# Altium integrated library WE_WR-TBL_Pluggable System_3.81 mm_rev15b.IntLib: 215 symbols (part 2 of 2)
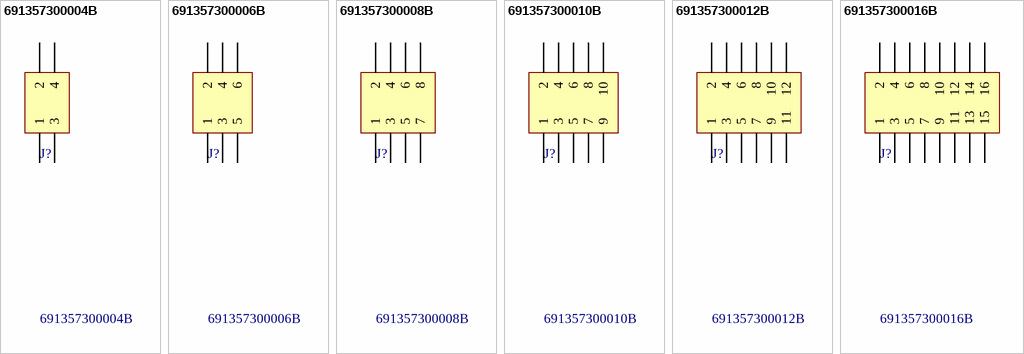
[diagram p20: symbols 691357300004B to 691357300016B]

## 691357300010B
designator J?
WR-TBL Terminal block - serie 357 B - 3.81 mm; Manufacturer: Würth Elektronik eiSos GmbH; ComponentLink1 Description: Manufacturer; ComponentLink2 Description: Datasheet; NoPins: 10; Created Date: 6 January 2014; partNo: 691357300010B; ComponentLink1URL: http://www.we-online.com; ComponentLink2URL: http://katalog.we-online.de/em/datasheet/6913573000xxB.pdf; Created by: Karrer Zheng
footprint 691357300010B (3,81mm - PCB - Double level - Vertical - with flanges - 10p)
pins: 1, 2, 3, 4, 5, 6, 7, 8, 9, 10

## 691357300012B
designator J?
WR-TBL Terminal block - serie 357 B - 3.81 mm; Manufacturer: Würth Elektronik eiSos GmbH; ComponentLink1 Description: Manufacturer; ComponentLink2 Description: Datasheet; NoPins: 12; Created Date: 6 January 2014; partNo: 691357300012B; ComponentLink1URL: http://www.we-online.com; ComponentLink2URL: http://katalog.we-online.de/em/datasheet/6913573000xxB.pdf; Created by: Karrer Zheng
footprint 691357300012B (3,81mm - PCB - Double level - Vertical - with flanges - 12p)
pins: 1, 2, 3, 4, 5, 6, 7, 8, 9, 10, 11, 12

## 691357300016B
designator J?
WR-TBL Terminal block - serie 357 B - 3.81 mm; Manufacturer: Würth Elektronik eiSos GmbH; ComponentLink1 Description: Manufacturer; ComponentLink2 Description: Datasheet; NoPins: 16; Created Date: 6 January 2014; partNo: 691357300016B; ComponentLink1URL: http://www.we-online.com; ComponentLink2URL: http://katalog.we-online.de/em/datasheet/6913573000xxB.pdf; Created by: Karrer Zheng
footprint 691357300016B (3,81mm - PCB - Double level - Vertical - with flanges - 16p)
pins: 1, 2, 3, 4, 5, 6, 7, 8, 9, 10, 11, 12, 13, 14, 15, 16


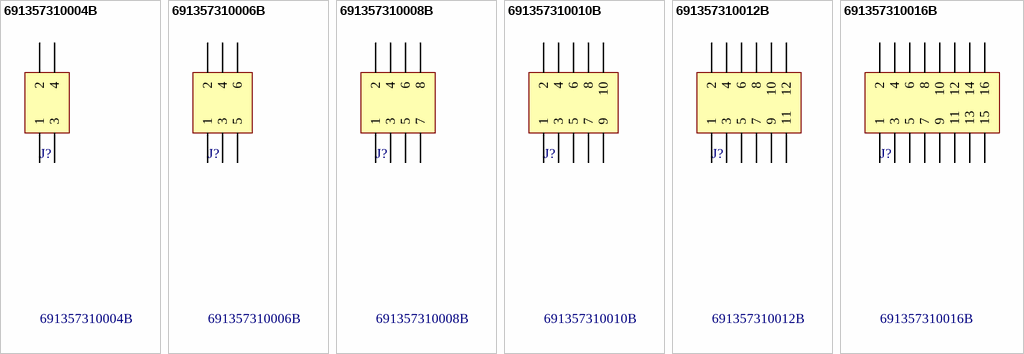
[diagram p15: symbols 691357310004B to 691357310016B]

## 691357310004B
designator J?
WR-TBL Terminal block - serie 357 B - 3.81 mm; Manufacturer: Würth Elektronik eiSos GmbH; ComponentLink1 Description: Manufacturer; ComponentLink2 Description: Datasheet; NoPins: 04; Created Date: 6 January 2014; partNo: 691357310004B; ComponentLink1URL: http://www.we-online.com; ComponentLink2URL: http://katalog.we-online.de/em/datasheet/6913573100xxB.pdf; Created by: Karrer Zheng
footprint 691357310004B (3,81mm - PCB - Double level - Horizontal - with flanges - 04p)
pins: 1, 2, 3, 4

## 691357310006B
designator J?
WR-TBL Terminal block - serie 357 B - 3.81 mm; Manufacturer: Würth Elektronik eiSos GmbH; ComponentLink1 Description: Manufacturer; ComponentLink2 Description: Datasheet; NoPins: 06; Created Date: 6 January 2014; partNo: 691357310006B; ComponentLink1URL: http://www.we-online.com; ComponentLink2URL: http://katalog.we-online.de/em/datasheet/6913573100xxB.pdf; Created by: Karrer Zheng
footprint 691357310006B (3,81mm - PCB - Double level - Horizontal - with flanges - 06p)
pins: 1, 2, 3, 4, 5, 6

## 691357310008B
designator J?
WR-TBL Terminal block - serie 357 B - 3.81 mm; Manufacturer: Würth Elektronik eiSos GmbH; ComponentLink1 Description: Manufacturer; ComponentLink2 Description: Datasheet; NoPins: 08; Created Date: 6 January 2014; partNo: 691357310008B; ComponentLink1URL: http://www.we-online.com; ComponentLink2URL: http://katalog.we-online.de/em/datasheet/6913573100xxB.pdf; Created by: Karrer Zheng
footprint 691357310008B (3,81mm - PCB - Double level - Horizontal - with flanges - 08p)
pins: 1, 2, 3, 4, 5, 6, 7, 8

## 691357310010B
designator J?
WR-TBL Terminal block - serie 357 B - 3.81 mm; Manufacturer: Würth Elektronik eiSos GmbH; ComponentLink1 Description: Manufacturer; ComponentLink2 Description: Datasheet; NoPins: 10; Created Date: 6 January 2014; partNo: 691357310010B; ComponentLink1URL: http://www.we-online.com; ComponentLink2URL: http://katalog.we-online.de/em/datasheet/6913573100xxB.pdf; Created by: Karrer Zheng
footprint 691357310010B (3,81mm - PCB - Double level - Horizontal - with flanges - 10p)
pins: 1, 2, 3, 4, 5, 6, 7, 8, 9, 10

## 691357310012B
designator J?
WR-TBL Terminal block - serie 357 B - 3.81 mm; Manufacturer: Würth Elektronik eiSos GmbH; ComponentLink1 Description: Manufacturer; ComponentLink2 Description: Datasheet; NoPins: 12; Created Date: 6 January 2014; partNo: 691357310012B; ComponentLink1URL: http://www.we-online.com; ComponentLink2URL: http://katalog.we-online.de/em/datasheet/6913573100xxB.pdf; Created by: Karrer Zheng
footprint 691357310012B (3,81mm - PCB - Double level - Horizontal - with flanges - 12p)
pins: 1, 2, 3, 4, 5, 6, 7, 8, 9, 10, 11, 12

## 691357310016B
designator J?
WR-TBL Terminal block - serie 357 B - 3.81 mm; Manufacturer: Würth Elektronik eiSos GmbH; ComponentLink1 Description: Manufacturer; ComponentLink2 Description: Datasheet; NoPins: 16; Created Date: 6 January 2014; partNo: 691357310016B; ComponentLink1URL: http://www.we-online.com; ComponentLink2URL: http://katalog.we-online.de/em/datasheet/6913573100xxB.pdf; Created by: Karrer Zheng
footprint 691357310016B (3,81mm - PCB - Double level - Horizontal - with flanges - 16p)
pins: 1, 2, 3, 4, 5, 6, 7, 8, 9, 10, 11, 12, 13, 14, 15, 16


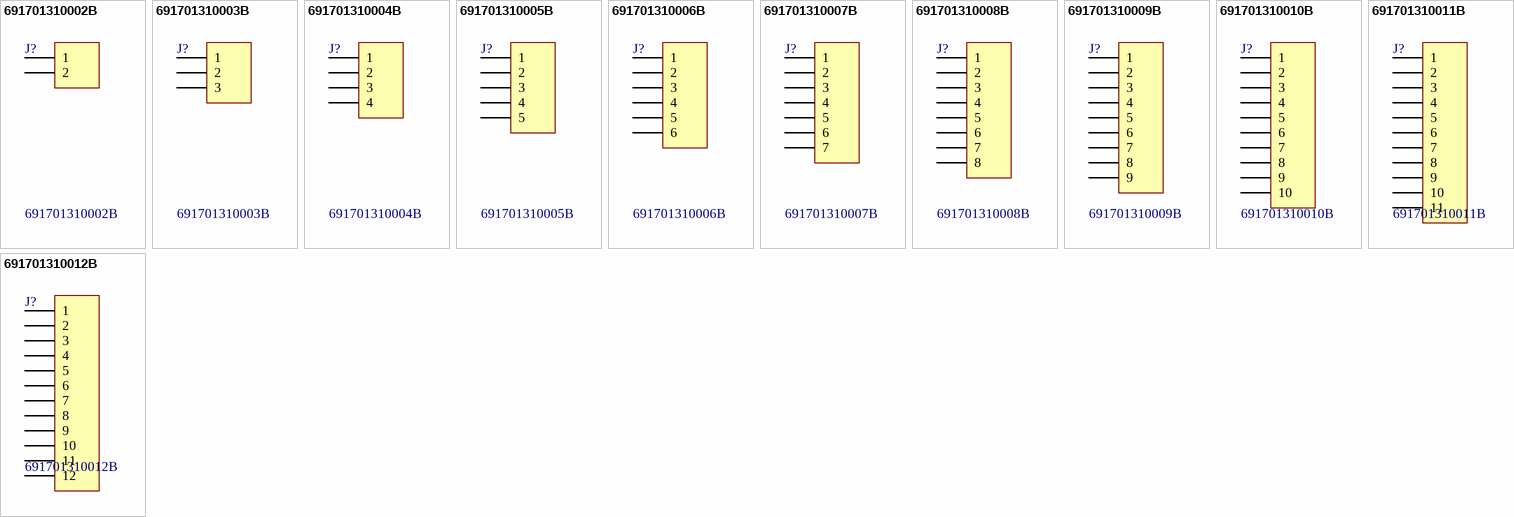
[diagram p16: symbols 691701310002B to 691701310012B]

## 691701310002B
designator J?
WR-TBL Terminal block - serie 7013 B- 3.81 mm; Manufacturer: Würth Elektronik eiSos GmbH; ComponentLink1 Description: Manufacturer; ComponentLink2 Description: Datasheet; NoPins: 2; Created Date: 12 December 2013; partNo: 691701310002B; ComponentLink1URL: http://www.we-online.com; ComponentLink2URL: http://katalog.we-online.de/em/datasheet/6917013100xxB.pdf; Created by: Karrer Zheng
footprint 691701310002B (THR - 3,81mm - PCB Vertical Close - 02p)
pins: 1, 2

## 691701310003B
designator J?
WR-TBL Terminal block - serie 7013 B- 3.81 mm; Manufacturer: Würth Elektronik eiSos GmbH; ComponentLink1 Description: Manufacturer; ComponentLink2 Description: Datasheet; NoPins: 3; Created Date: 12 December 2013; partNo: 691701310003B; ComponentLink1URL: http://www.we-online.com; ComponentLink2URL: http://katalog.we-online.de/em/datasheet/6917013100xxB.pdf; Created by: Karrer Zheng
footprint 691701310003B (THR - 3,81mm - PCB Vertical Close - 03p)
pins: 1, 2, 3

## 691701310004B
designator J?
WR-TBL Terminal block - serie 7013 B- 3.81 mm; Manufacturer: Würth Elektronik eiSos GmbH; ComponentLink1 Description: Manufacturer; ComponentLink2 Description: Datasheet; NoPins: 4; Created Date: 12 December 2013; partNo: 691701310004B; ComponentLink1URL: http://www.we-online.com; ComponentLink2URL: http://katalog.we-online.de/em/datasheet/6917013100xxB.pdf; Created by: Karrer Zheng
footprint 691701310004B (THR - 3,81mm - PCB Vertical Close - 04p)
pins: 1, 2, 3, 4

## 691701310005B
designator J?
WR-TBL Terminal block - serie 7013 B- 3.81 mm; Manufacturer: Würth Elektronik eiSos GmbH; ComponentLink1 Description: Manufacturer; ComponentLink2 Description: Datasheet; NoPins: 5; Created Date: 12 December 2013; partNo: 691701310005B; ComponentLink1URL: http://www.we-online.com; ComponentLink2URL: http://katalog.we-online.de/em/datasheet/6917013100xxB.pdf; Created by: Karrer Zheng
footprint 691701310005B (THR - 3,81mm - PCB Vertical Close - 05p)
pins: 1, 2, 3, 4, 5

## 691701310006B
designator J?
WR-TBL Terminal block - serie 7013 B- 3.81 mm; Manufacturer: Würth Elektronik eiSos GmbH; ComponentLink1 Description: Manufacturer; ComponentLink2 Description: Datasheet; NoPins: 6; Created Date: 12 December 2013; partNo: 691701310006B; ComponentLink1URL: http://www.we-online.com; ComponentLink2URL: http://katalog.we-online.de/em/datasheet/6917013100xxB.pdf; Created by: Karrer Zheng
footprint 691701310006B (THR - 3,81mm - PCB Vertical Close - 06p)
pins: 1, 2, 3, 4, 5, 6

## 691701310007B
designator J?
WR-TBL Terminal block - serie 7013 B- 3.81 mm; Manufacturer: Würth Elektronik eiSos GmbH; ComponentLink1 Description: Manufacturer; ComponentLink2 Description: Datasheet; NoPins: 7; Created Date: 12 December 2013; partNo: 691701310007B; ComponentLink1URL: http://www.we-online.com; ComponentLink2URL: http://katalog.we-online.de/em/datasheet/6917013100xxB.pdf; Created by: Karrer Zheng
footprint 691701310007B (THR - 3,81mm - PCB Vertical Close - 07p)
pins: 1, 2, 3, 4, 5, 6, 7

## 691701310008B
designator J?
WR-TBL Terminal block - serie 7013 B- 3.81 mm; Manufacturer: Würth Elektronik eiSos GmbH; ComponentLink1 Description: Manufacturer; ComponentLink2 Description: Datasheet; NoPins: 8; Created Date: 12 December 2013; partNo: 691701310008B; ComponentLink1URL: http://www.we-online.com; ComponentLink2URL: http://katalog.we-online.de/em/datasheet/6917013100xxB.pdf; Created by: Karrer Zheng
footprint 691701310008B (THR - 3,81mm - PCB Vertical Close - 08p)
pins: 1, 2, 3, 4, 5, 6, 7, 8

## 691701310009B
designator J?
WR-TBL Terminal block - serie 7013 B- 3.81 mm; Manufacturer: Würth Elektronik eiSos GmbH; ComponentLink1 Description: Manufacturer; ComponentLink2 Description: Datasheet; NoPins: 9; Created Date: 12 December 2013; partNo: 691701310009B; ComponentLink1URL: http://www.we-online.com; ComponentLink2URL: http://katalog.we-online.de/em/datasheet/6917013100xxB.pdf; Created by: Karrer Zheng
footprint 691701310009B (THR - 3,81mm - PCB Vertical Close - 09p)
pins: 1, 2, 3, 4, 5, 6, 7, 8, 9

## 691701310010B
designator J?
WR-TBL Terminal block - serie 7013 B- 3.81 mm; Manufacturer: Würth Elektronik eiSos GmbH; ComponentLink1 Description: Manufacturer; ComponentLink2 Description: Datasheet; NoPins: 10; Created Date: 12 December 2013; partNo: 691701310010B; ComponentLink1URL: http://www.we-online.com; ComponentLink2URL: http://katalog.we-online.de/em/datasheet/6917013100xxB.pdf; Created by: Karrer Zheng
footprint 691701310010B (THR - 3,81mm - PCB Vertical Close - 10p)
pins: 1, 2, 3, 4, 5, 6, 7, 8, 9, 10

## 691701310011B
designator J?
WR-TBL Terminal block - serie 7013 B- 3.81 mm; Manufacturer: Würth Elektronik eiSos GmbH; ComponentLink1 Description: Manufacturer; ComponentLink2 Description: Datasheet; NoPins: 11; Created Date: 12 December 2013; partNo: 691701310011B; ComponentLink1URL: http://www.we-online.com; ComponentLink2URL: http://katalog.we-online.de/em/datasheet/6917013100xxB.pdf; Created by: Karrer Zheng
footprint 691701310011B (THR - 3,81mm - PCB Vertical Close - 11p)
pins: 1, 2, 3, 4, 5, 6, 7, 8, 9, 10, 11

## 691701310012B
designator J?
WR-TBL Terminal block - serie 7013 B- 3.81 mm; Manufacturer: Würth Elektronik eiSos GmbH; ComponentLink1 Description: Manufacturer; ComponentLink2 Description: Datasheet; NoPins: 12; Created Date: 12 December 2013; partNo: 691701310012B; ComponentLink1URL: http://www.we-online.com; ComponentLink2URL: http://katalog.we-online.de/em/datasheet/6917013100xxB.pdf; Created by: Karrer Zheng
footprint 691701310012B (THR - 3,81mm - PCB Vertical Close - 12p)
pins: 1, 2, 3, 4, 5, 6, 7, 8, 9, 10, 11, 12


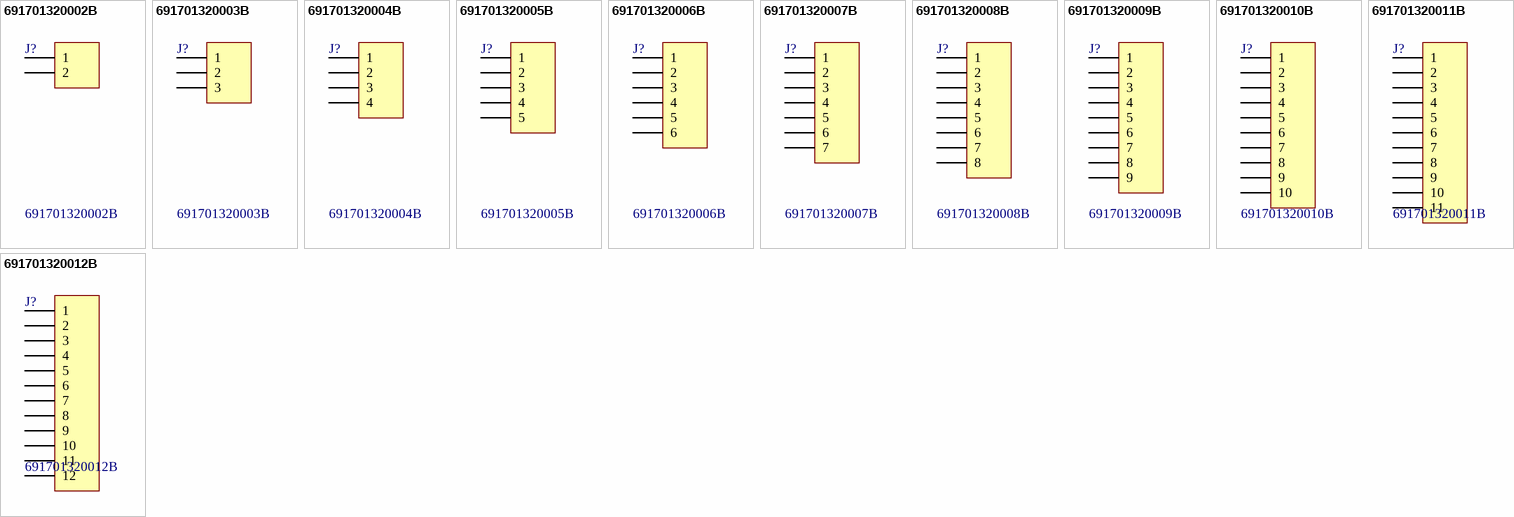
[diagram p17: symbols 691701320002B to 691701320012B]

## 691701320002B
designator J?
WR-TBL Terminal block - serie 7013 VF- 3.81 mm; Manufacturer: Würth Elektronik eiSos GmbH; ComponentLink1 Description: Manufacturer; ComponentLink2 Description: Datasheet; NoPins: 2; Created Date: 18 December 2013; partNo: 691701320002B; ComponentLink1URL: http://www.we-online.com; ComponentLink2URL: http://katalog.we-online.de/em/datasheet/6917013200xxB.pdf; Created by: Karrer Zheng
footprint 691701320002B
pins: 1, 2

## 691701320003B
designator J?
WR-TBL Terminal block - serie 7013 VF- 3.81 mm; Manufacturer: Würth Elektronik eiSos GmbH; ComponentLink1 Description: Manufacturer; ComponentLink2 Description: Datasheet; NoPins: 3; Created Date: 18 December 2013; partNo: 691701320003B; ComponentLink1URL: http://www.we-online.com; ComponentLink2URL: http://katalog.we-online.de/em/datasheet/6917013200xxB.pdf; Created by: Karrer Zheng
footprint 691701320003B (THR - 3,81mm - PCB Vertical Flange - 03p)
pins: 1, 2, 3

## 691701320004B
designator J?
WR-TBL Terminal block - serie 7013 VF- 3.81 mm; Manufacturer: Würth Elektronik eiSos GmbH; ComponentLink1 Description: Manufacturer; ComponentLink2 Description: Datasheet; NoPins: 4; Created Date: 18 December 2013; partNo: 691701320004B; ComponentLink1URL: http://www.we-online.com; ComponentLink2URL: http://katalog.we-online.de/em/datasheet/6917013200xxB.pdf; Created by: Karrer Zheng
footprint 691701320004B (THR - 3,81mm - PCB Vertical Flange - 04p)
pins: 1, 2, 3, 4

## 691701320005B
designator J?
WR-TBL Terminal block - serie 7013 VF- 3.81 mm; Manufacturer: Würth Elektronik eiSos GmbH; ComponentLink1 Description: Manufacturer; ComponentLink2 Description: Datasheet; NoPins: 5; Created Date: 18 December 2013; partNo: 691701320005B; ComponentLink1URL: http://www.we-online.com; ComponentLink2URL: http://katalog.we-online.de/em/datasheet/6917013200xxB.pdf; Created by: Karrer Zheng
footprint 691701320005B (THR - 3,81mm - PCB Vertical Flange - 05p)
pins: 1, 2, 3, 4, 5

## 691701320006B
designator J?
WR-TBL Terminal block - serie 7013 VF- 3.81 mm; Manufacturer: Würth Elektronik eiSos GmbH; ComponentLink1 Description: Manufacturer; ComponentLink2 Description: Datasheet; NoPins: 6; Created Date: 18 December 2013; partNo: 691701320006B; ComponentLink1URL: http://www.we-online.com; ComponentLink2URL: http://katalog.we-online.de/em/datasheet/6917013200xxB.pdf; Created by: Karrer Zheng
footprint 691701320006B (THR - 3,81mm - PCB Vertical Flange - 06p)
pins: 1, 2, 3, 4, 5, 6

## 691701320007B
designator J?
WR-TBL Terminal block - serie 7013 VF- 3.81 mm; Manufacturer: Würth Elektronik eiSos GmbH; ComponentLink1 Description: Manufacturer; ComponentLink2 Description: Datasheet; NoPins: 7; Created Date: 18 December 2013; partNo: 691701320007B; ComponentLink1URL: http://www.we-online.com; ComponentLink2URL: http://katalog.we-online.de/em/datasheet/6917013200xxB.pdf; Created by: Karrer Zheng
footprint 691701320007B (THR - 3,81mm - PCB Vertical Flange - 07p)
pins: 1, 2, 3, 4, 5, 6, 7

## 691701320008B
designator J?
WR-TBL Terminal block - serie 7013 VF- 3.81 mm; Manufacturer: Würth Elektronik eiSos GmbH; ComponentLink1 Description: Manufacturer; ComponentLink2 Description: Datasheet; NoPins: 8; Created Date: 18 December 2013; partNo: 691701320008B; ComponentLink1URL: http://www.we-online.com; ComponentLink2URL: http://katalog.we-online.de/em/datasheet/6917013200xxB.pdf; Created by: Karrer Zheng
footprint 691701320008B (THR - 3,81mm - PCB Vertical Flange - 08p)
pins: 1, 2, 3, 4, 5, 6, 7, 8

## 691701320009B
designator J?
WR-TBL Terminal block - serie 7013 VF- 3.81 mm; Manufacturer: Würth Elektronik eiSos GmbH; ComponentLink1 Description: Manufacturer; ComponentLink2 Description: Datasheet; NoPins: 9; Created Date: 18 December 2013; partNo: 691701320009B; ComponentLink1URL: http://www.we-online.com; ComponentLink2URL: http://katalog.we-online.de/em/datasheet/6917013200xxB.pdf; Created by: Karrer Zheng
footprint 691701320009B (THR - 3,81mm - PCB Vertical Flange - 09p)
pins: 1, 2, 3, 4, 5, 6, 7, 8, 9

## 691701320010B
designator J?
WR-TBL Terminal block - serie 7013 VF- 3.81 mm; Manufacturer: Würth Elektronik eiSos GmbH; ComponentLink1 Description: Manufacturer; ComponentLink2 Description: Datasheet; NoPins: 10; Created Date: 18 December 2013; partNo: 691701320010B; ComponentLink1URL: http://www.we-online.com; ComponentLink2URL: http://katalog.we-online.de/em/datasheet/6917013200xxB.pdf; Created by: Karrer Zheng
footprint 691701320010B (THR - 3,81mm - PCB Vertical Flange - 10p)
pins: 1, 2, 3, 4, 5, 6, 7, 8, 9, 10

## 691701320011B
designator J?
WR-TBL Terminal block - serie 7013 VF- 3.81 mm; Manufacturer: Würth Elektronik eiSos GmbH; ComponentLink1 Description: Manufacturer; ComponentLink2 Description: Datasheet; NoPins: 11; Created Date: 18 December 2013; partNo: 691701320011B; ComponentLink1URL: http://www.we-online.com; ComponentLink2URL: http://katalog.we-online.de/em/datasheet/6917013200xxB.pdf; Created by: Karrer Zheng
footprint 691701320011B (THR - 3,81mm - PCB Vertical Flange - 11p)
pins: 1, 2, 3, 4, 5, 6, 7, 8, 9, 10, 11

## 691701320012B
designator J?
WR-TBL Terminal block - serie 7013 VF- 3.81 mm; Manufacturer: Würth Elektronik eiSos GmbH; ComponentLink1 Description: Manufacturer; ComponentLink2 Description: Datasheet; NoPins: 12; Created Date: 18 December 2013; partNo: 691701320012B; ComponentLink1URL: http://www.we-online.com; ComponentLink2URL: http://katalog.we-online.de/em/datasheet/6917013200xxB.pdf; Created by: Karrer Zheng
footprint 691701320012B (THR - 3,81mm - PCB Vertical Flange - 12p)
pins: 1, 2, 3, 4, 5, 6, 7, 8, 9, 10, 11, 12


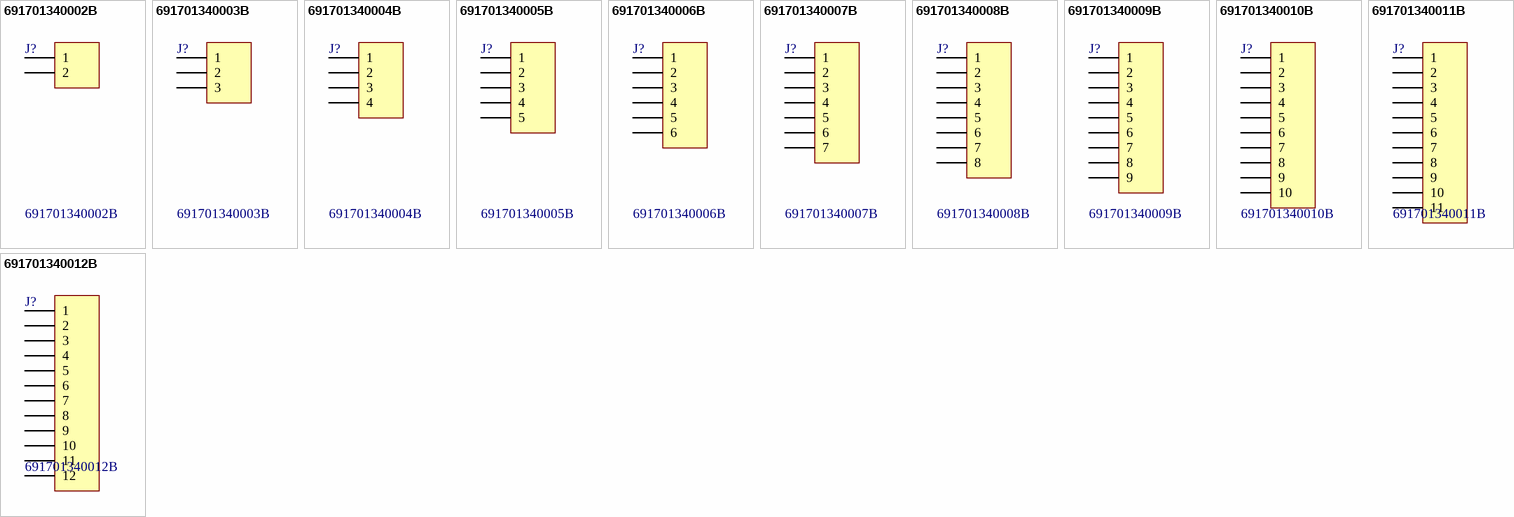
[diagram p18: symbols 691701340002B to 691701340012B]

## 691701340002B
designator J?
WR-TBL Terminal block - serie 7013 B - 3.81 mm; Manufacturer: Würth Elektronik eiSos GmbH; ComponentLink1 Description: Manufacturer; ComponentLink2 Description: Datasheet; NoPins: 02; Created Date: 24 December 2013; partNo: 691701340002B; ComponentLink1URL: http://www.we-online.com; ComponentLink2URL: http://katalog.we-online.de/em/datasheet/6917013400xxB.pdf; Created by: Karrer Zheng
footprint 691701340002B (THR - 3,81mm - PCB Horizontal Close - 02p)
pins: 1, 2

## 691701340003B
designator J?
WR-TBL Terminal block - serie 7013 B - 3.81 mm; Manufacturer: Würth Elektronik eiSos GmbH; ComponentLink1 Description: Manufacturer; ComponentLink2 Description: Datasheet; NoPins: 03; Created Date: 24 December 2013; partNo: 691701340003B; ComponentLink1URL: http://www.we-online.com; ComponentLink2URL: http://katalog.we-online.de/em/datasheet/6917013400xxB.pdf; Created by: Karrer Zheng
footprint 691701340003B (THR - 3,81mm - PCB Horizontal Close - 03p)
pins: 1, 2, 3

## 691701340004B
designator J?
WR-TBL Terminal block - serie 7013 B - 3.81 mm; Manufacturer: Würth Elektronik eiSos GmbH; ComponentLink1 Description: Manufacturer; ComponentLink2 Description: Datasheet; NoPins: 04; Created Date: 24 December 2013; partNo: 691701340004B; ComponentLink1URL: http://www.we-online.com; ComponentLink2URL: http://katalog.we-online.de/em/datasheet/6917013400xxB.pdf; Created by: Karrer Zheng
footprint 691701340004B (THR - 3,81mm - PCB Horizontal Close - 04p)
pins: 1, 2, 3, 4

## 691701340005B
designator J?
WR-TBL Terminal block - serie 7013 B - 3.81 mm; Manufacturer: Würth Elektronik eiSos GmbH; ComponentLink1 Description: Manufacturer; ComponentLink2 Description: Datasheet; NoPins: 05; Created Date: 24 December 2013; partNo: 691701340005B; ComponentLink1URL: http://www.we-online.com; ComponentLink2URL: http://katalog.we-online.de/em/datasheet/6917013400xxB.pdf; Created by: Karrer Zheng
footprint 691701340005B (THR - 3,81mm - PCB Horizontal Close - 05p)
pins: 1, 2, 3, 4, 5

## 691701340006B
designator J?
WR-TBL Terminal block - serie 7013 B - 3.81 mm; Manufacturer: Würth Elektronik eiSos GmbH; ComponentLink1 Description: Manufacturer; ComponentLink2 Description: Datasheet; NoPins: 06; Created Date: 24 December 2013; partNo: 691701340006B; ComponentLink1URL: http://www.we-online.com; ComponentLink2URL: http://katalog.we-online.de/em/datasheet/6917013400xxB.pdf; Created by: Karrer Zheng
footprint 691701340006B (THR - 3,81mm - PCB Horizontal Close - 06p)
pins: 1, 2, 3, 4, 5, 6

## 691701340007B
designator J?
WR-TBL Terminal block - serie 7013 B - 3.81 mm; Manufacturer: Würth Elektronik eiSos GmbH; ComponentLink1 Description: Manufacturer; ComponentLink2 Description: Datasheet; NoPins: 07; Created Date: 24 December 2013; partNo: 691701340007B; ComponentLink1URL: http://www.we-online.com; ComponentLink2URL: http://katalog.we-online.de/em/datasheet/6917013400xxB.pdf; Created by: Karrer Zheng
footprint 691701340007B (THR - 3,81mm - PCB Horizontal Close - 07p)
pins: 1, 2, 3, 4, 5, 6, 7

## 691701340008B
designator J?
WR-TBL Terminal block - serie 7013 B - 3.81 mm; Manufacturer: Würth Elektronik eiSos GmbH; ComponentLink1 Description: Manufacturer; ComponentLink2 Description: Datasheet; NoPins: 08; Created Date: 24 December 2013; partNo: 691701340008B; ComponentLink1URL: http://www.we-online.com; ComponentLink2URL: http://katalog.we-online.de/em/datasheet/6917013400xxB.pdf; Created by: Karrer Zheng
footprint 691701340008B (THR - 3,81mm - PCB Horizontal Close - 08p)
pins: 1, 2, 3, 4, 5, 6, 7, 8

## 691701340009B
designator J?
WR-TBL Terminal block - serie 7013 B - 3.81 mm; Manufacturer: Würth Elektronik eiSos GmbH; ComponentLink1 Description: Manufacturer; ComponentLink2 Description: Datasheet; NoPins: 09; Created Date: 24 December 2013; partNo: 691701340009B; ComponentLink1URL: http://www.we-online.com; ComponentLink2URL: http://katalog.we-online.de/em/datasheet/6917013400xxB.pdf; Created by: Karrer Zheng
footprint 691701340009B (THR - 3,81mm - PCB Horizontal Close - 09p)
pins: 1, 2, 3, 4, 5, 6, 7, 8, 9

## 691701340010B
designator J?
WR-TBL Terminal block - serie 7013 B - 3.81 mm; Manufacturer: Würth Elektronik eiSos GmbH; ComponentLink1 Description: Manufacturer; ComponentLink2 Description: Datasheet; NoPins: 10; Created Date: 24 December 2013; partNo: 691701340010B; ComponentLink1URL: http://www.we-online.com; ComponentLink2URL: http://katalog.we-online.de/em/datasheet/6917013400xxB.pdf; Created by: Karrer Zheng
footprint 691701340010B (THR - 3,81mm - PCB Horizontal Close - 10p)
pins: 1, 2, 3, 4, 5, 6, 7, 8, 9, 10

## 691701340011B
designator J?
WR-TBL Terminal block - serie 7013 B - 3.81 mm; Manufacturer: Würth Elektronik eiSos GmbH; ComponentLink1 Description: Manufacturer; ComponentLink2 Description: Datasheet; NoPins: 11; Created Date: 24 December 2013; partNo: 691701340011B; ComponentLink1URL: http://www.we-online.com; ComponentLink2URL: http://katalog.we-online.de/em/datasheet/6917013400xxB.pdf; Created by: Karrer Zheng
footprint 691701340011B (THR - 3,81mm - PCB Horizontal Close - 11p)
pins: 1, 2, 3, 4, 5, 6, 7, 8, 9, 10, 11

## 691701340012B
designator J?
WR-TBL Terminal block - serie 7013 B - 3.81 mm; Manufacturer: Würth Elektronik eiSos GmbH; ComponentLink1 Description: Manufacturer; ComponentLink2 Description: Datasheet; NoPins: 12; Created Date: 24 December 2013; partNo: 691701340012B; ComponentLink1URL: http://www.we-online.com; ComponentLink2URL: http://katalog.we-online.de/em/datasheet/6917013400xxB.pdf; Created by: Karrer Zheng
footprint 691701340012B (THR - 3,81mm - PCB Horizontal Close - 12p)
pins: 1, 2, 3, 4, 5, 6, 7, 8, 9, 10, 11, 12


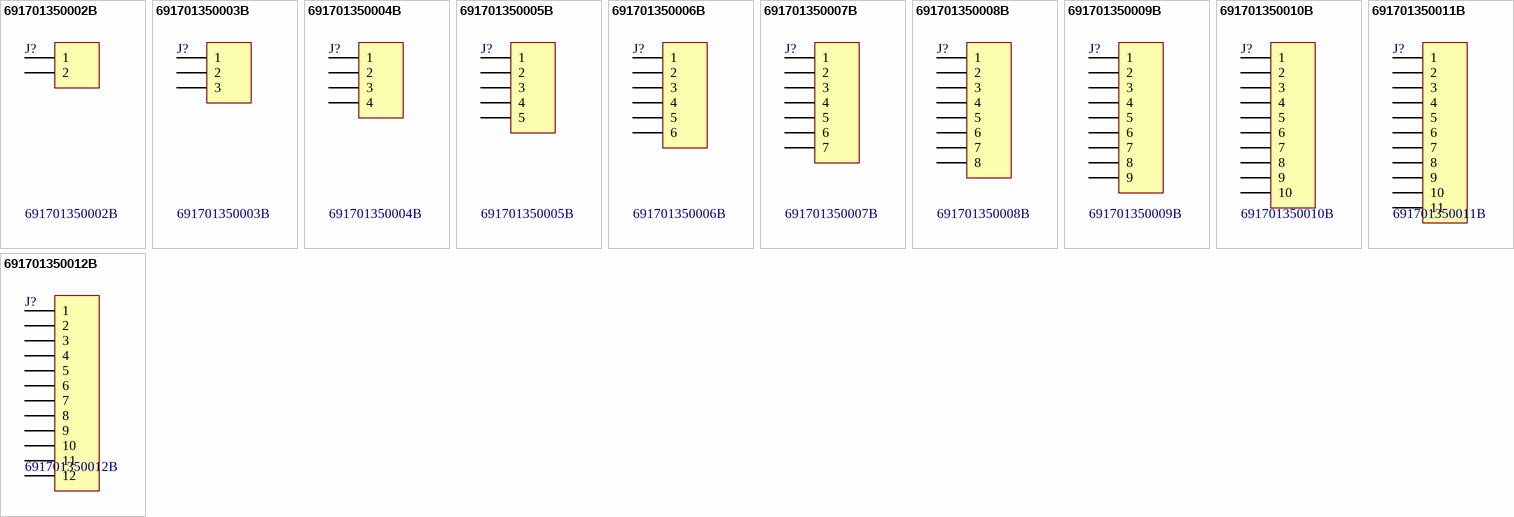
[diagram p19: symbols 691701350002B to 691701350012B]

## 691701350002B
designator J?
WR-TBL Terminal block - serie 7013 B- 3.81 mm; Manufacturer: Würth Elektronik eiSos GmbH; ComponentLink1 Description: Manufacturer; ComponentLink2 Description: Datasheet; NoPins: 02; Created Date: 27 December 2013; partNo: 691701350002B; ComponentLink1URL: http://www.we-online.com; ComponentLink2URL: http://katalog.we-online.de/em/datasheet/6917013500xxB.pdf; Created by: Karrer Zheng
footprint 691701350002B (THR - 3,81mm - PCB Horizontal Flange - 02p)
pins: 1, 2

## 691701350003B
designator J?
WR-TBL Terminal block - serie 7013 B- 3.81 mm; Manufacturer: Würth Elektronik eiSos GmbH; ComponentLink1 Description: Manufacturer; ComponentLink2 Description: Datasheet; NoPins: 03; Created Date: 27 December 2013; partNo: 691701350003B; ComponentLink1URL: http://www.we-online.com; ComponentLink2URL: http://katalog.we-online.de/em/datasheet/6917013500xxB.pdf; Created by: Karrer Zheng
footprint 691701350003B (THR - 3,81mm - PCB Horizontal Flange - 03p)
pins: 1, 2, 3

## 691701350004B
designator J?
WR-TBL Terminal block - serie 7013 B- 3.81 mm; Manufacturer: Würth Elektronik eiSos GmbH; ComponentLink1 Description: Manufacturer; ComponentLink2 Description: Datasheet; NoPins: 04; Created Date: 27 December 2013; partNo: 691701350004B; ComponentLink1URL: http://www.we-online.com; ComponentLink2URL: http://katalog.we-online.de/em/datasheet/6917013500xxB.pdf; Created by: Karrer Zheng
footprint 691701350004B (THR - 3,81mm - PCB Horizontal Flange - 04p)
pins: 1, 2, 3, 4

## 691701350005B
designator J?
WR-TBL Terminal block - serie 7013 B- 3.81 mm; Manufacturer: Würth Elektronik eiSos GmbH; ComponentLink1 Description: Manufacturer; ComponentLink2 Description: Datasheet; NoPins: 05; Created Date: 27 December 2013; partNo: 691701350005B; ComponentLink1URL: http://www.we-online.com; ComponentLink2URL: http://katalog.we-online.de/em/datasheet/6917013500xxB.pdf; Created by: Karrer Zheng
footprint 691701350005B (THR - 3,81mm - PCB Horizontal Flange - 05p)
pins: 1, 2, 3, 4, 5

## 691701350006B
designator J?
WR-TBL Terminal block - serie 7013 B- 3.81 mm; Manufacturer: Würth Elektronik eiSos GmbH; ComponentLink1 Description: Manufacturer; ComponentLink2 Description: Datasheet; NoPins: 06; Created Date: 27 December 2013; partNo: 691701350006B; ComponentLink1URL: http://www.we-online.com; ComponentLink2URL: http://katalog.we-online.de/em/datasheet/6917013500xxB.pdf; Created by: Karrer Zheng
footprint 691701350006B (THR - 3,81mm - PCB Horizontal Flange - 06p)
pins: 1, 2, 3, 4, 5, 6

## 691701350007B
designator J?
WR-TBL Terminal block - serie 7013 B- 3.81 mm; Manufacturer: Würth Elektronik eiSos GmbH; ComponentLink1 Description: Manufacturer; ComponentLink2 Description: Datasheet; NoPins: 07; Created Date: 27 December 2013; partNo: 691701350007B; ComponentLink1URL: http://www.we-online.com; ComponentLink2URL: http://katalog.we-online.de/em/datasheet/6917013500xxB.pdf; Created by: Karrer Zheng
footprint 691701350007B (THR - 3,81mm - PCB Horizontal Flange - 07p)
pins: 1, 2, 3, 4, 5, 6, 7

## 691701350008B
designator J?
WR-TBL Terminal block - serie 7013 B- 3.81 mm; Manufacturer: Würth Elektronik eiSos GmbH; ComponentLink1 Description: Manufacturer; ComponentLink2 Description: Datasheet; NoPins: 08; Created Date: 27 December 2013; partNo: 691701350008B; ComponentLink1URL: http://www.we-online.com; ComponentLink2URL: http://katalog.we-online.de/em/datasheet/6917013500xxB.pdf; Created by: Karrer Zheng
footprint 691701350008B (THR - 3,81mm - PCB Horizontal Flange - 08p)
pins: 1, 2, 3, 4, 5, 6, 7, 8

## 691701350009B
designator J?
WR-TBL Terminal block - serie 7013 B- 3.81 mm; Manufacturer: Würth Elektronik eiSos GmbH; ComponentLink1 Description: Manufacturer; ComponentLink2 Description: Datasheet; NoPins: 09; Created Date: 27 December 2013; partNo: 691701350009B; ComponentLink1URL: http://www.we-online.com; ComponentLink2URL: http://katalog.we-online.de/em/datasheet/6917013500xxB.pdf; Created by: Karrer Zheng
footprint 691701350009B (THR - 3,81mm - PCB Horizontal Flange - 09p)
pins: 1, 2, 3, 4, 5, 6, 7, 8, 9

## 691701350010B
designator J?
WR-TBL Terminal block - serie 7013 B- 3.81 mm; Manufacturer: Würth Elektronik eiSos GmbH; ComponentLink1 Description: Manufacturer; ComponentLink2 Description: Datasheet; NoPins: 10; Created Date: 27 December 2013; partNo: 691701350010B; ComponentLink1URL: http://www.we-online.com; ComponentLink2URL: http://katalog.we-online.de/em/datasheet/6917013500xxB.pdf; Created by: Karrer Zheng
footprint 691701350010B (THR - 3,81mm - PCB Horizontal Flange - 10p)
pins: 1, 2, 3, 4, 5, 6, 7, 8, 9, 10

## 691701350011B
designator J?
WR-TBL Terminal block - serie 7013 B- 3.81 mm; Manufacturer: Würth Elektronik eiSos GmbH; ComponentLink1 Description: Manufacturer; ComponentLink2 Description: Datasheet; NoPins: 11; Created Date: 27 December 2013; partNo: 691701350011B; ComponentLink1URL: http://www.we-online.com; ComponentLink2URL: http://katalog.we-online.de/em/datasheet/6917013500xxB.pdf; Created by: Karrer Zheng
footprint 691701350011B (THR - 3,81mm - PCB Horizontal Flange - 11p)
pins: 1, 2, 3, 4, 5, 6, 7, 8, 9, 10, 11

## 691701350012B
designator J?
WR-TBL Terminal block - serie 7013 B- 3.81 mm; Manufacturer: Würth Elektronik eiSos GmbH; ComponentLink1 Description: Manufacturer; ComponentLink2 Description: Datasheet; NoPins: 12; Created Date: 27 December 2013; partNo: 691701350012B; ComponentLink1URL: http://www.we-online.com; ComponentLink2URL: http://katalog.we-online.de/em/datasheet/6917013500xxB.pdf; Created by: Karrer Zheng
footprint 691701350012B (THR - 3,81mm - PCB Horizontal Flange - 12p)
pins: 1, 2, 3, 4, 5, 6, 7, 8, 9, 10, 11, 12